# Altium footprint library General.PCBLIB: 231 footprints (part 13 of 15)
Each footprint in its own frame and in the unit in brackets; x right, y up, seen from the top. Pads: shape width x height; smd on the part's side, far side on the other; paste and mask are expansions set on the pad; w line width, h text height; cw(c..) or ccw(c..) is an arc to the next point about the centre after c.
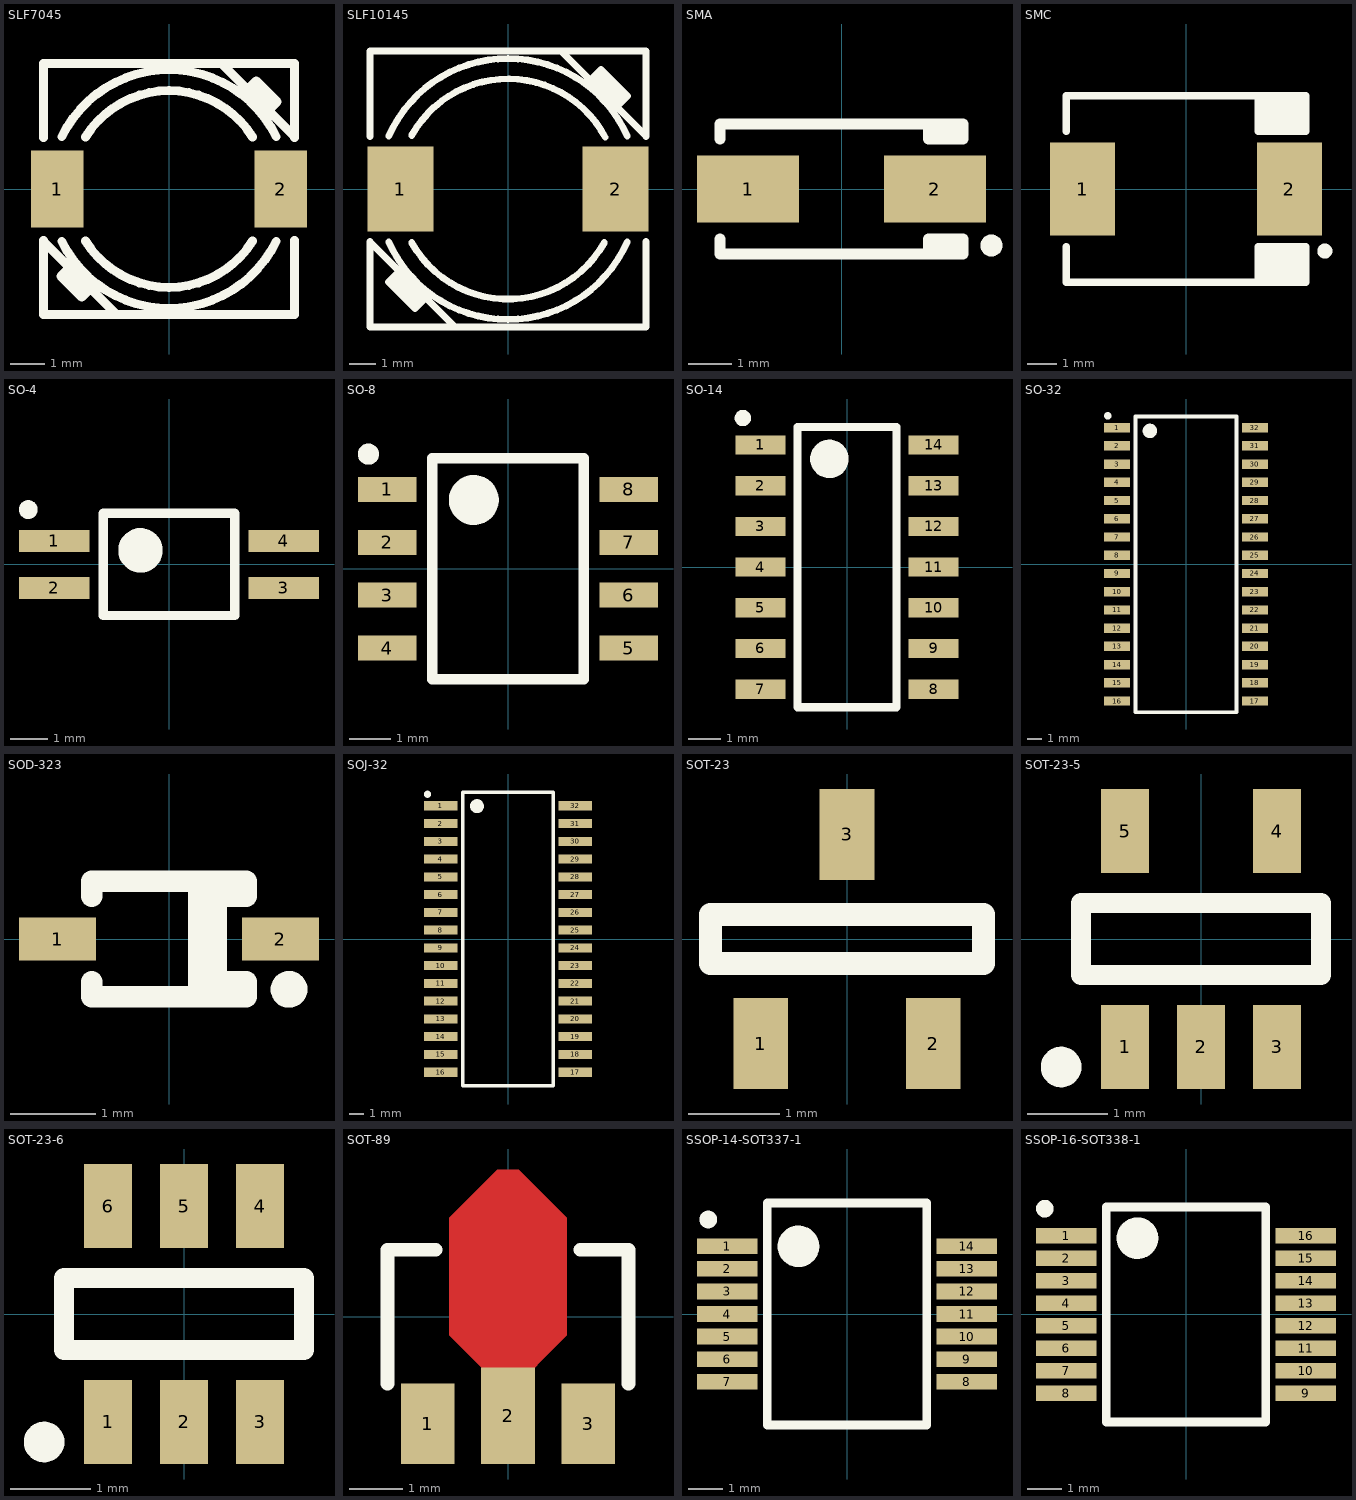
[diagram p12: the footprints below, top view; thin cyan lines are the x and y axes]

## SLF7045 [mm] "TDK, Inductor, SMD, SLF7045"
height 4.5
pads (2):
  rect 1.5x2.2 smd: 1(-3.2,0) 2(3.2,0)
Top Overlay:
  lines w0.254: -3.6,-1.5 -1.5,-3.6 ; -3.6,-1.48 -3.6,-3.6 3.6,-3.6 3.6,-1.48 ; -3.6,1.48 -3.6,3.6 3.6,3.6 3.6,1.48 ; -3.074,-1.499 ccw(c0,0) 3.074,-1.499 ; -3.074,1.499 cw(c0,0) 3.074,1.499 ; -3,-2.4 -2.4,-3 ; -2.8,-2.2 -3.1,-2.5 -2.5,-3.1 -2.2,-2.8 ; -2.391,-1.494 ccw(c0,0) 2.391,-1.494 ; -2.391,1.494 cw(c0,0) 2.391,1.494 ; 1.5,3.6 3.6,1.5 ; 2.2,2.8 2.5,3.1 3.1,2.5 2.8,2.2 ; 2.4,3 3,2.4
3D body "SUMIDA-CDRR75.STEP": height 4.5, standoff -0.03, extent -3.525,-3.5 3.525,3.5

## SLF10145 [mm] "TDK, Inductor, SMD, SLF10145"
height 4.5
pads (2):
  rect 2.5x3.2 smd: 1(-4.05,0) 2(4.05,0)
Top Overlay:
  lines w0.254: -5.2,-2 -2,-5.2 ; -5.2,-1.98 -5.2,-5.2 5.2,-5.2 5.2,-1.98 ; -5.2,1.98 -5.2,5.2 5.2,5.2 5.2,1.98 ; -4.49,-1.999 ccw(c0,0) 4.49,-1.999 ; -4.49,1.999 cw(c0,0) 4.49,1.999 ; -4.4,-3.4 -3.4,-4.4 ; -4.3,-3.3 -3.3,-4.3 ; -4.2,-3.2 -3.2,-4.2 ; -4,-3 -4.5,-3.5 -3.5,-4.5 -3,-4 ; -3.63,-2.012 ccw(c0,0) 3.63,-2.012 ; -3.63,2.012 cw(c0,0) 3.664,1.948 ; 2,5.2 5.2,2 ; 3,4 3.5,4.5 4.5,3.5 4,3 ; 3.2,4.2 4.2,3.2 ; 3.3,4.3 4.3,3.3 ; 3.4,4.4 4.4,3.4
3D body "SUMIDA-CDRR105.STEP": height 4.5, standoff -0.03, extent -5.025,-5 5.025,5

## SMA [mm] "DO-214AC"
height 2.03
pads (2):
  rect 2.35x1.55 smd: 1(-2.15,0) 2(2.15,0)
Top Overlay:
  circle w0.254: c3.45,-1.3 r0.127
  lines w0.254: -2.8,-1.15 -2.8,-1.5 2.8,-1.5 2.8,-1.15 2,-1.15 2,-1.5 ; -2.8,1.15 -2.8,1.5 2.8,1.5 2.8,1.15 2,1.15 2,1.5 ; 2.2,-1.5 2.2,-1.15 ; 2.2,1.15 2.2,1.5 ; 2.4,-1.5 2.4,-1.15 ; 2.4,1.15 2.4,1.5 ; 2.6,-1.5 2.6,-1.15 ; 2.6,1.15 2.6,1.5
3D body "SMA.STEP": height 2.64, standoff 0.02, extent -2.6,-1.3 2.6,1.3

## SMC [mm] "DO-214AB"
height 2.65
pads (2):
  rect 2.2x3.15 smd: 1(-3.5,0) 2(3.5,0)
Top Overlay:
  circle w0.254: c4.7,-2.1 r0.127
  lines w0.254: -4.05,-1.95 -4.05,-3.15 4.05,-3.15 4.05,-1.95 2.45,-1.95 2.45,-3.15 ; -4.05,1.95 -4.05,3.15 4.05,3.15 4.05,1.95 2.45,1.95 2.45,3.15 ; 2.65,-3.15 2.65,-1.95 ; 2.65,1.95 2.65,3.15 ; 2.85,-3.15 2.85,-1.95 ; 2.85,1.95 2.85,3.15 ; 3.05,-3.15 3.05,-1.95 ; 3.05,1.95 3.05,3.15 ; 3.25,-3.15 3.25,-1.95 ; 3.25,1.95 3.25,3.15 ; 3.45,-3.15 3.45,-1.95 ; 3.45,1.95 3.45,3.15 ; 3.65,-3.15 3.65,-1.95 ; 3.65,1.95 3.65,3.15 ; 3.85,-3.15 3.85,-1.95 ; 3.85,1.95 3.85,3.15
3D body "SMC.STEP": height 2.67, standoff 0.02, extent -3.95,-2.95 3.95,2.95

## SO-4 [mm] "SOIC, 4PIN"
height 1.9
pads (4):
  rect 1.9x0.6 smd: 1(-3.1,0.635) 2(-3.1,-0.635) 3(3.1,-0.635) 4(3.1,0.635)
Top Overlay:
  circle w0.6: c-0.77,0.38 r0.3
  circle w0.254: c-3.8,1.48 r0.127
  lines w0.254: -1.77,-1.38 -1.77,1.38 1.77,1.38 1.77,-1.38 -1.77,-1.38
3D body "SOIC127P-4N.step": height 1.9, standoff 0, extent -3.5,-1.3 3.5,1.3

## SO-8 [mm] "SOIC, 8PIN"
height 1.7
pads (8):
  rect 1.4x0.6 smd: 1(-2.9,1.905) 2(-2.9,0.635) 3(-2.9,-0.635) 4(-2.9,-1.905) 5(2.9,-1.905) 6(2.9,-0.635) 7(2.9,0.635) 8(2.9,1.905)
Top Overlay:
  circle w0.6: c-0.82,1.65 r0.3
  circle w0.254: c-3.35,2.75 r0.127
  lines w0.254: -1.82,-2.65 -1.82,2.65 1.82,2.65 1.82,-2.65 -1.82,-2.65
3D body "SOIC127P600X180-8N.STEP": height 1.95, standoff 0, extent -3.03,-2.565 3.026,2.565

## SO-14 [mm] "SOIC, 14PIN"
height 1.7
pads (14):
  rect 1.55x0.6 smd: 1(-2.7,3.81) 2(-2.7,2.54) 3(-2.7,1.27) 4(-2.7,0) 5(-2.7,-1.27) 6(-2.7,-2.54) 7(-2.7,-3.81) 8(2.7,-3.81) 9(2.7,-2.54) 10(2.7,-1.27) 11(2.7,0) 12(2.7,1.27) 13(2.7,2.54) 14(2.7,3.81)
Top Overlay:
  circle w0.254: c-3.25,4.65 r0.127
  circle w0.6: c-0.55,3.375 r0.3
  lines w0.254: -1.55,-4.375 1.55,-4.375 1.55,4.375 -1.55,4.375 -1.55,-4.375
3D body "SOIC127P600X173-14N.STEP": height 1.88, standoff 0, extent -3.03,-4.37 3.026,4.37

## SO-32 [mm] "SOIC, 32PIN"
height 2.65
pads (32):
  rect 1.8x0.65 smd: 1(-4.8,9.525) 2(-4.8,8.255) 3(-4.8,6.985) 4(-4.8,5.715) 5(-4.8,4.445) 6(-4.8,3.175) 7(-4.8,1.905) 8(-4.8,0.635) 9(-4.8,-0.635) 10(-4.8,-1.905) 11(-4.8,-3.175) 12(-4.8,-4.445) 13(-4.8,-5.715) 14(-4.8,-6.985) 15(-4.8,-8.255) 16(-4.8,-9.525) 17(4.8,-9.525) 18(4.8,-8.255) 19(4.8,-6.985) 20(4.8,-5.715) 21(4.8,-4.445) 22(4.8,-3.175) 23(4.8,-1.905) 24(4.8,-0.635) 25(4.8,0.635) 26(4.8,1.905) 27(4.8,3.175) 28(4.8,4.445) 29(4.8,5.715) 30(4.8,6.985) 31(4.8,8.255) 32(4.8,9.525)
Top Overlay:
  circle w0.5: c-2.52,9.3 r0.25
  circle w0.254: c-5.45,10.35 r0.127
  lines w0.254: -3.52,-10.3 3.52,-10.3 3.52,10.3 -3.52,10.3 -3.52,-10.3
3D body "SOIC127P1047X264-32N.STEP": height 2.79, standoff 0, extent -5.265,-10.485 5.261,10.445

## SOD-323 [mm] "SOD-323"
height 1.1
pads (2):
  rect 0.9x0.5 smd: 1(-1.3,0) 2(1.3,0)
Top Overlay:
  circle w0.254: c1.4,-0.587 r0.088
  lines w0.254: -0.9,-0.5 -0.9,-0.675 0.9,-0.675 0.9,-0.5 0.55,-0.5 ; -0.9,0.5 -0.9,0.675 0.9,0.675 0.9,0.5 0.55,0.5 ; 0.35,-0.675 0.35,0.675 ; 0.55,-0.675 0.55,0.675 ; 0.7,-0.675 0.7,-0.5 ; 0.7,0.5 0.7,0.675
3D body "SOD-323.STEP": height 1.1, standoff 0, extent -1.35,-0.625 1.35,0.625

## SOJ-32 [mm] "SOJ, 32PIN"
height 3.75
pads (32):
  rect 2.4x0.65 smd: 1(-4.8,9.525) 2(-4.8,8.255) 3(-4.8,6.985) 4(-4.8,5.715) 5(-4.8,4.445) 6(-4.8,3.175) 7(-4.8,1.905) 8(-4.8,0.635) 9(-4.8,-0.635) 10(-4.8,-1.905) 11(-4.8,-3.175) 12(-4.8,-4.445) 13(-4.8,-5.715) 14(-4.8,-6.985) 15(-4.8,-8.255) 16(-4.8,-9.525) 17(4.8,-9.525) 18(4.8,-8.255) 19(4.8,-6.985) 20(4.8,-5.715) 21(4.8,-4.445) 22(4.8,-3.175) 23(4.8,-1.905) 24(4.8,-0.635) 25(4.8,0.635) 26(4.8,1.905) 27(4.8,3.175) 28(4.8,4.445) 29(4.8,5.715) 30(4.8,6.985) 31(4.8,8.255) 32(4.8,9.525)
Top Overlay:
  circle w0.5: c-2.22,9.5 r0.25
  circle w0.254: c-5.75,10.35 r0.127
  lines w0.254: -3.22,-10.5 3.22,-10.5 3.22,10.5 -3.22,10.5 -3.22,-10.5
3D body "SOIC127P1047X264-32N.STEP": height 2.79, standoff 0, extent -5.265,-10.465 5.261,10.465

## SOT-23 [mm] "SOT-23-3"
height 1.1
pads (3):
  rect 0.6x1 smd: 1(-0.95,-1.15) 2(0.95,-1.15) 3(0,1.15)
Top Overlay:
  lines w0.254: -1.5,-0.27 1.5,-0.27 1.5,0.27 -1.5,0.27 -1.5,-0.27
3D body "SOT-23-3.STEP": height 0.99, standoff 0.01, extent -1.46,-1.275 1.46,1.273

## SOT-23-5 [mm] "SOT-23-5"
height 1.2
pads (5):
  rect 0.6x1.05 smd: 1(-0.95,-1.35) 2(0,-1.35) 3(0.95,-1.35) 4(0.95,1.35) 5(-0.95,1.35)
Top Overlay:
  circle w0.254: c-1.75,-1.6 r0.127
  lines w0.254: -1.5,-0.45 -1.5,0.45 1.5,0.45 1.5,-0.45 -1.5,-0.45
3D body "SOT-23-5.STEP": height 1.3, standoff 0, extent -1.5,-1.5 1.5,1.5

## SOT-23-6 [mm] "SOT-23-6"
height 1.2
pads (6):
  rect 0.6x1.05 smd: 1(-0.95,-1.35) 2(0,-1.35) 3(0.95,-1.35) 4(0.95,1.35) 5(0,1.35) 6(-0.95,1.35)
Top Overlay:
  circle w0.254: c-1.75,-1.6 r0.127
  lines w0.254: -1.5,-0.45 -1.5,0.45 1.5,0.45 1.5,-0.45 -1.5,-0.45
3D body "SOT-23-6.STEP": height 1.3, standoff 0, extent -1.5,-1.5 1.5,1.5

## SOT-89 [mm] "SOT-89, TO-243AA"
height 1.5
pads (3):
  rect 1x1.5 smd: 1(-1.5,-2) 3(1.5,-2)
  rect 1x1.8 smd: 2(0,-1.85)
Top Layer:
  rectangle: -1.1,-0.35 1.1,1.85
  rectangle: -0.198,1.848 0.202,2.748
  region: 0.202,0.952 1.1,1.85 0.202,2.748 -0.696,1.85
  region: -0.202,0.952 0.696,1.85 -0.202,2.748 -1.1,1.85
  region: 0,-1.45 1.1,-0.35 0,0.75 -1.1,-0.35
Top Overlay:
  lines w0.254: -2.25,-1.25 -2.25,1.25 -1.35,1.25 ; 1.35,1.25 2.25,1.25 2.25,-1.25
Top Solder:
  region: 0,-1.591 1.2,-0.391 0,0.809 -1.2,-0.391
  rectangle: -1.2,-0.391 1.2,1.891
  region: -0.241,0.933 0.717,1.891 -0.241,2.85 -1.2,1.891
  region: 0.241,0.933 1.2,1.891 0.241,2.85 -0.717,1.891
  rectangle: -0.241,1.891 0.241,2.85
3D body "SOT-89.STEP": height 1.54, standoff 0, extent -2.25,-2.25 2.25,2

## SSOP-14-SOT337-1 [mm] "SSOP, 14PIN, SOT337"
height 2
pads (14):
  rect 1.75x0.45 smd: 1(-3.45,1.95) 2(-3.45,1.3) 3(-3.45,0.65) 4(-3.45,0) 5(-3.45,-0.65) 6(-3.45,-1.3) 7(-3.45,-1.95) 8(3.45,-1.95) 9(3.45,-1.3) 10(3.45,-0.65) 11(3.45,0) 12(3.45,0.65) 13(3.45,1.3) 14(3.45,1.95)
Top Overlay:
  circle w0.254: c-4,2.725 r0.127
  circle w0.6: c-1.4,1.95 r0.3
  lines w0.254: -2.3,-3.2 2.3,-3.2 2.3,3.2 -2.3,3.2 -2.3,-3.2
3D body "SOP65P775X200-14N MO-150 SSOP14-SOT337-1.step": height 2.15, standoff 0, extent -3.903,-3.2 3.903,3.2

## SSOP-16-SOT338-1 [mm] "SSOP, 16PIN, SOT338-1"
height 2
pads (16):
  rect 1.75x0.45 smd: 1(-3.45,2.275) 2(-3.45,1.625) 3(-3.45,0.975) 4(-3.45,0.325) 5(-3.45,-0.325) 6(-3.45,-0.975) 7(-3.45,-1.625) 8(-3.45,-2.275) 9(3.45,-2.275) 10(3.45,-1.625) 11(3.45,-0.975) 12(3.45,-0.325) 13(3.45,0.325) 14(3.45,0.975) 15(3.45,1.625) 16(3.45,2.275)
Top Overlay:
  circle w0.254: c-4.07,3.05 r0.127
  circle w0.6: c-1.4,2.2 r0.3
  lines w0.254: -2.3,-3.1 2.3,-3.1 2.3,3.1 -2.3,3.1 -2.3,-3.1
3D body "SOP65P775X200-16N MO-150 SSOP16-SOT338-1.step": height 2.15, standoff 0, extent -3.903,-3.2 3.903,3.2